# Altium footprint library Connectors.PcbLib: 72 footprints (part 3 of 5)
Each footprint in its own frame and in the unit in brackets; x right, y up, seen from the top. Pads: shape width x height; smd on the part's side, far side on the other; paste and mask are expansions set on the pad; w line width, h text height; cw(c..) or ccw(c..) is an arc to the next point about the centre after c.
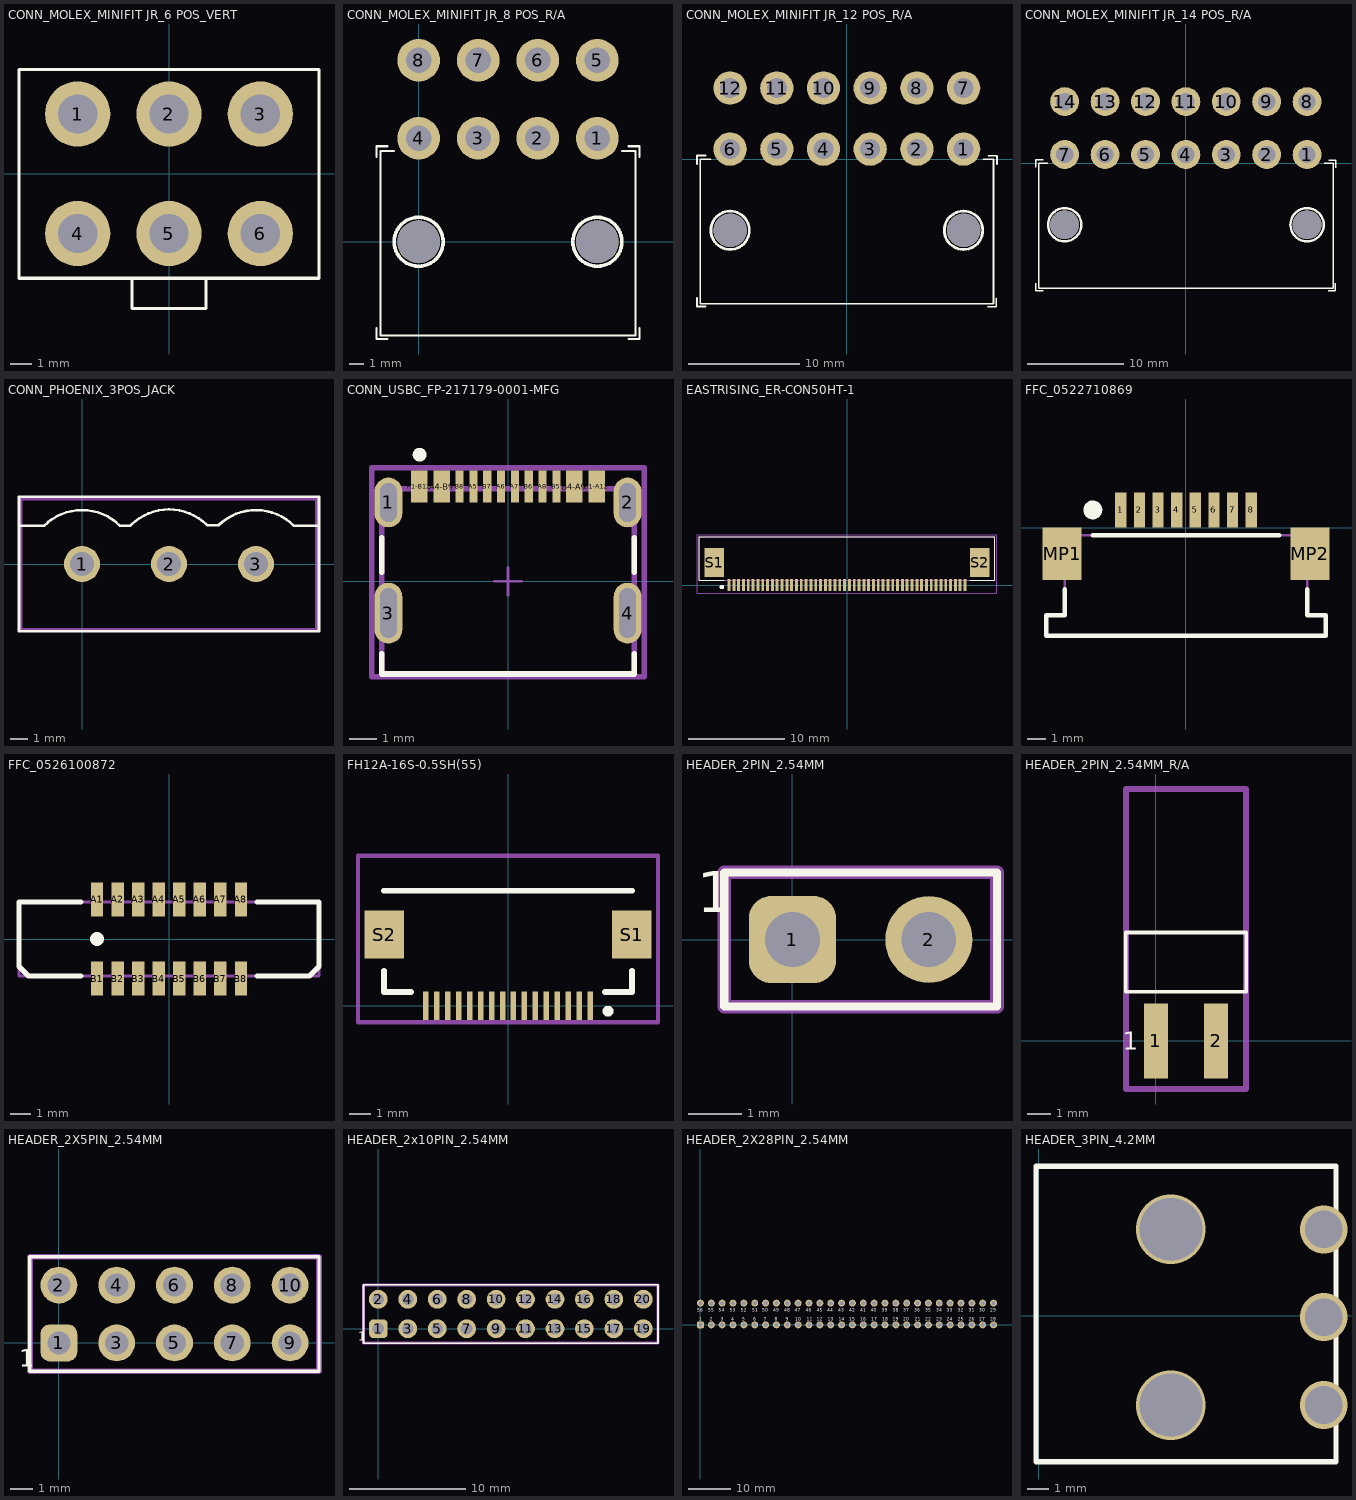
[diagram p2: the footprints below, top view; thin cyan lines are the x and y axes]

## CONN_MOLEX_MINIFIT JR_6 POS_VERT [mm] "Molex Minifit Jr 5566 6 Pos VERT"
pads (6):
  round 3 hole 1.8: 1(-4.2,2.75) 2(0,2.75) 4(-4.2,-2.75) 5(0,-2.75)
  round 3 hole 1.801: 3(4.2,2.75) 6(4.2,-2.75)
Top Overlay:
  lines w0.127: -1.7,-6.2 1.7,-6.2 1.7,-4.8 -1.7,-4.8 -1.7,-6.2
  lines w0.152: -6.9,-4.8 6.9,-4.8 6.9,4.8 -6.9,4.8 -6.9,-4.8
3D body "39-28-8060.stp": height 12.81, standoff -3.49, extent -7.234,-6.174 7.366,4.826

## CONN_MOLEX_MINIFIT JR_8 POS_R/A [mm] "Molex Minifit Jr 5569 8 Pos R/A"
pads (10):
  round 3 hole 1.801: 1(12.6,7.3) 2(8.4,7.3) 5(12.6,12.8) 6(8.4,12.8)
  round 3 hole 1.8: 3(4.2,7.3) 4(0,7.3) 7(4.2,12.8) 8(0,12.8)
  round 3 hole 3 unplated mask+0: ""(0,0) ""(12.6,0)
Top Overlay:
  circle w0.254: c0,0 r1.727
  circle w0.254: c12.6,0 r1.727
  lines w0.152: -2.98,-6.096 -2.98,-6.858 -2.218,-6.858 ; -2.98,5.969 -2.98,6.731 -2.218,6.731 ; -1.76,6.4 -2.7,6.4 -2.7,-6.604 15.3,-6.604 15.3,6.4 14.36,6.4 ; 14.818,-6.858 15.58,-6.858 15.58,-6.096 ; 14.818,6.731 15.58,6.731 15.58,5.969
3D body "039301080.stp": height 11.01, standoff -3.99, extent -2.7,-6.6 15.7,13.335

## CONN_MOLEX_MINIFIT JR_12 POS_R/A [mm] "Molex Minifit Jr 5569 12 Pos R/A"
pads (14):
  round 3 hole 1.801: 1(10.5,0.9) 2(6.3,0.9) 3(2.1,0.9) 4(-2.1,0.9) 7(10.5,6.4) 8(6.3,6.4) 9(2.1,6.4) 10(-2.1,6.4)
  round 3 hole 1.8: 5(-6.3,0.9) 6(-10.5,0.9) 11(-6.3,6.4) 12(-10.5,6.4)
  round 3 hole 3 unplated mask+0: ""(-10.5,-6.4) ""(10.5,-6.4)
Top Overlay:
  circle w0.254: c10.5,-6.4 r1.727
  circle w0.254: c-10.5,-6.4 r1.727
  lines w0.152: -13.48,-12.496 -13.48,-13.258 -12.718,-13.258 ; -13.48,-0.431 -13.48,0.331 -12.718,0.331 ; -12.26,0 -13.2,0 -13.2,-13.004 13.2,-13.004 13.2,0 12.26,0 ; 12.684,-13.27 13.446,-13.27 13.446,-12.508 ; 12.744,0.301 13.506,0.301 13.506,-0.461
3D body "039300120.stp": height 11.01, standoff -3.99, extent -13.274,-13.083 13.526,6.852

## CONN_MOLEX_MINIFIT JR_14 POS_R/A [mm] "Molex Minifit Jr 5569 14 Pos R/A"
pads (16):
  round 3 hole 1.801: 1(12.6,0.9) 2(8.4,0.9) 3(4.2,0.9) 4(0,0.9) 8(12.6,6.4) 9(8.4,6.4) 10(4.2,6.4) 11(0,6.4)
  round 3 hole 1.8: 5(-4.2,0.9) 6(-8.4,0.9) 7(-12.6,0.9) 12(-4.2,6.4) 13(-8.4,6.4) 14(-12.6,6.4)
  round 3 hole 3 unplated mask+0: ""(-12.6,-6.4) ""(12.6,-6.4)
Top Overlay:
  circle w0.254: c-12.6,-6.4 r1.727
  circle w0.254: c12.6,-6.4 r1.727
  lines w0.152: -15.58,-12.496 -15.58,-13.258 -14.818,-13.258 ; -15.58,-0.431 -15.58,0.331 -14.818,0.331 ; -14.36,0 -15.3,0 -15.3,-13.004 15.3,-13.004 15.3,0 14.36,0 ; 14.784,-13.27 15.546,-13.27 15.546,-12.508 ; 14.844,0.301 15.606,0.301 15.606,-0.461
3D body "039301140.stp": height 11.4, standoff -3.6, extent -15.3,-12.9 15.7,7.035

## CONN_PHOENIX_3POS_JACK [mm] "3 position phoenix connector jack end"
pads (3):
  round 2.1 hole 1.4: 1(0,0) 2(5.08,0) 3(10.16,0)
Top Overlay:
  lines w0.152: -3.683,2.227 -2.227,2.227 cw(c0,0) 2.227,2.227 2.814,2.227 ; 2.853,2.266 cw(c5.08,0.038) 7.307,2.266 7.933,2.266 ; 7.972,2.266 cw(c10.16,0) 12.387,2.227 13.843,2.227 ; -3.683,-3.937 13.843,-3.937 13.843,3.937 -3.683,3.937 -3.683,-3.937
Mechanical 1:
  lines w0.152: -3.54,-3.81 13.7,-3.81 13.7,3.8 -3.54,3.8 -3.54,-3.81
3D body "pxc_1755749_04_MSTBVA-2-5-3-G-5-08_3D.stp": height 12.01, standoff -3.89, extent -3.537,-4.7 13.703,3.87

## CONN_USBC_FP-217179-0001-MFG [mm] "USB-C (USB TYPE-C) USB 2.0 Receptacle Connector 24 (16+8 Dummy) Position Surface Mount, Right Angle; Through Hole"
pads (16):
  rrect100% 1x1.8 hole 1.4 slot 0.6 at 0 deg paste-2539.97 mask+0: 1(-4.32,2.85) 2(4.32,2.85)
  rrect100% 1x2.2 hole 1.8 slot 0.6 at 0 deg paste-2539.97 mask+0: 3(-4.32,-1.15) 4(4.32,-1.15)
  rect 0.6x1.15 smd paste+0 mask+0: A1-B12(-3.2,3.425) A4-B9(-2.4,3.425) B1-A12(3.2,3.425) B4-A9(2.4,3.425)
  rect 0.3x1.15 smd paste+0 mask+0: A5(-1.25,3.425) A6(-0.25,3.425) A7(0.25,3.425) A8(1.25,3.425) B5(1.75,3.425) B6(0.75,3.425) B7(-0.75,3.425) B8(-1.75,3.425)
Top Overlay:
  circle w0.25: c-3.195,4.575 r0.125
  lines w0.2: -4.57,-2.625 -4.57,-3.35 4.57,-3.35 4.57,-2.625 ; -4.57,0.325 -4.57,1.575 ; 4.57,0.325 4.57,1.575
Top 3D Body:
  lines w0.2: -4.57,-3.35 4.57,-3.35 4.57,3.35 -4.57,3.35 -4.57,-3.35
Top Assembly:
  lines w0.2: -4.92,-3.45 4.92,-3.45 4.92,4.1 -4.92,4.1 -4.92,-3.45
  text ".Designator" at 0,0.513 h1
Top Courtyard:
  lines w0.2: -4.92,-3.45 4.92,-3.45 4.92,4.1 -4.92,4.1 -4.92,-3.45
Top Component Center:
  lines w0.1: -0.5,0 0.5,0 ; 0,-0.5 0,0.5
3D body "Conn_Molex_217179-0001_eec.STEP": height 0.25, standoff 0, extent -4.92,-3.45 4.92,4.1

## EASTRISING_ER-CON50HT-1 [mm]
pads (52):
  rect 0.3x1.25 smd: 1(-12.25,0) 2(-11.75,0) 3(-11.25,0) 4(-10.75,0) 5(-10.25,0) 6(-9.75,0) 7(-9.25,0) 8(-8.75,0) 9(-8.25,0) 10(-7.75,0) 11(-7.25,0) 12(-6.75,0) 13(-6.25,0) 14(-5.75,0) 15(-5.25,0) 16(-4.75,0) 17(-4.25,0) 18(-3.75,0) 19(-3.25,0) 20(-2.75,0) 21(-2.25,0) 22(-1.75,0) 23(-1.25,0) 24(-0.75,0) 25(-0.25,0) 26(0.25,0) 27(0.75,0) 28(1.25,0) 29(1.75,0) 30(2.25,0) 31(2.75,0) 32(3.25,0) 33(3.75,0) 34(4.25,0) 35(4.75,0) 36(5.25,0) 37(5.75,0) 38(6.25,0) 39(6.75,0) 40(7.25,0) 41(7.75,0) 42(8.25,0) 43(8.75,0) 44(9.25,0) 45(9.75,0) 46(10.25,0) 47(10.75,0) 48(11.25,0) 49(11.75,0) 50(12.25,0)
  rect 2x3 smd: S1(-13.79,2.325) S2(13.79,2.325)
Top Overlay:
  circle w0.25: c-13,-0.2 r0.1
  lines w0.127: -12.75,0.5 -15.325,0.5 -15.325,5 15.325,5 15.325,0.5 12.75,0.5
Mechanical 13:
  circle w0.25: c-13,-0.2 r0.1
  lines w0.127: -15.325,0.5 15.325,0.5 15.325,5 -15.325,5 -15.325,0.5
Mechanical 15:
  lines w0.05: -15.575,-0.875 15.575,-0.875 15.575,5.25 -15.575,5.25 -15.575,-0.875

## FFC_0522710869 [mm] "Molex FFC 8 Bottom 1.00MM R/A"
pads (10):
  rect 0.6x1.9 smd: 1(-3.5,0.95) 2(-2.5,0.95) 3(-1.5,0.95) 4(-0.5,0.95) 5(0.5,0.95) 6(1.5,0.95) 7(2.5,0.95) 8(3.5,0.95)
  rect 2.1x2.8 smd: MP1(-6.65,-1.4) MP2(6.65,-1.4)
Top Overlay:
  circle w0.508: c-5,0.95 r0.254
  lines w0.254: -7.5,-4.7 -7.5,-5.8 7.5,-5.8 7.5,-4.7 ; -7.494,-4.7 -6.5,-4.7 -6.5,-3.3 ; -5,-0.4 5,-0.4 ; 6.5,-3.3 6.5,-4.7 7.494,-4.7
Mechanical 1:
  lines w0.127: -7.5,-4.7 -7.5,-5.8 7.5,-5.8 7.5,-4.7 ; -7.494,-4.7 -6.5,-4.7 -6.5,-0.4 6.5,-0.4 6.5,-4.7 7.494,-4.7
3D body "522710869.stp": height 3.01, standoff 0.01, extent -7.5,-5.8 7.5,1.6

## FFC_0526100872 [mm] "Molex FFC VERT 8POS 1.00MM SMD"
pads (16):
  rect 0.6x1.65 smd: A1(-3.5,1.925) A2(-2.5,1.925) A3(-1.5,1.925) A4(-0.5,1.925) A5(0.5,1.925) A6(1.5,1.925) A7(2.5,1.925) A8(3.5,1.925) B1(-3.5,-1.925) B2(-2.5,-1.925) B3(-1.5,-1.925) B4(-0.5,-1.925) B5(0.5,-1.925) B6(1.5,-1.925) B7(2.5,-1.925) B8(3.5,-1.925)
Top Overlay:
  circle w0.339: c-3.5,0 r0.169
  lines w0.254: -4.3,-1.8 -6.836,-1.8 -7.3,-1.336 -7.3,1.8 -4.3,1.8 ; 4.3,-1.8 6.836,-1.8 7.3,-1.336 7.3,1.8 4.3,1.8
Mechanical 1:
  lines w0.127: -7.3,-1.8 -7.3,1.8 7.3,1.8 7.3,-1.8 -7.3,-1.8
3D body "526100872.stp": height 5.76, standoff 0.01, extent -7.3,-2.25 7.3,2.25

## FH12A-16S-0.5SH(55) [mm]
pads (18):
  rect 0.25x1.3 smd mask+0.025: 1(3.75,0) 2(3.25,0) 3(2.75,0) 4(2.25,0) 5(1.75,0) 6(1.25,0) 7(0.75,0) 8(0.25,0) 9(-0.25,0) 10(-0.75,0) 11(-1.25,0) 12(-1.75,0) 13(-2.25,0) 14(-2.75,0) 15(-3.25,0) 16(-3.75,0)
  rect 1.8x2.2 smd: S1(5.65,3.25) S2(-5.65,3.25)
Top Overlay:
  circle w0.25: c4.572,-0.254 r0.125
  lines w0.25: -5.675,5.25 5.675,5.25
  lines w0.267: -5.675,1.6 -5.675,0.625 -4.435,0.625 ; 4.435,0.625 5.675,0.625 5.675,1.6
Mechanical 1:
  lines w0.203: -6.858,-0.762 6.858,-0.762 6.858,6.858 -6.858,6.858 -6.858,-0.762
3D body "FH12A-16S-0.5SH.stp": height 2.05, standoff -0.1, extent -6.25,-0.254 6.25,6.746

## HEADER_2PIN_2.54MM [mm]
pads (2):
  rrect50% 1.62x1.62 hole 1.02: 1(0,0)
  round 1.62 hole 1.02: 2(2.54,0)
Top Overlay:
  lines w0.152: -1.27,-1.25 3.81,-1.25 3.81,1.25 -1.27,1.25 -1.27,-1.25
  text "1" at -1.778,0.508 h0.76
Mechanical 1:
  lines w0.254: -1.27,-1.25 3.81,-1.25 3.81,1.25 -1.27,1.25 -1.27,-1.25
3D body "PREC002SAAN-RC.STEP": height 8.39, standoff -3.04, extent -1.27,-1.25 3.81,1.29

## HEADER_2PIN_2.54MM_R/A [mm]
pads (2):
  rect 1.02x3.17 smd: 1(0,0) 2(2.54,0)
Top Overlay:
  lines w0.152: -1.27,2.072 -1.27,4.572 3.81,4.572 3.81,2.072 -1.27,2.072
  text "1" at -1.397,-0.381 h0.76
Mechanical 1:
  lines w0.254: -1.27,-2.032 -1.27,10.628 3.81,10.628 3.81,-2.032 -1.27,-2.032
3D body "m20-8890245_asm.stp": height 2.51, standoff 0.01, extent -1.27,-0.944 3.81,10.552

## HEADER_2X5PIN_2.54MM [mm]
pads (10):
  rrect50% 1.62x1.62 hole 1.02: 1(0,0)
  round 1.62 hole 1.02: 2(0,2.54) 3(2.54,0) 4(2.54,2.54) 5(5.08,0) 6(5.08,2.54) 7(7.62,0) 8(7.62,2.54)
  round 1.62 hole 1: 9(10.16,0) 10(10.16,2.54)
Top Overlay:
  lines w0.152: -1.27,-1.25 11.43,-1.25 11.43,3.79 -1.27,3.79 -1.27,-1.25
  text "1" at -1.753,-1.041 h0.76
Mechanical 1:
  lines w0.254: -1.27,-1.25 11.43,-1.25 11.43,3.79 -1.27,3.79 -1.27,-1.25
3D body "Pin Header 2x5 TH Pitch 2.54mm.stp": height 9.5, standoff -3.2, extent -1.27,-1.27 11.43,3.81

## HEADER_2x10PIN_2.54MM [mm]
pads (20):
  rrect50% 1.62x1.62 hole 1.02: 1(0,0)
  round 1.62 hole 1.02: 2(0,2.54) 3(2.54,0) 4(2.54,2.54) 5(5.08,0) 6(5.08,2.54) 7(7.62,0) 8(7.62,2.54)
  round 1.62 hole 1: 9(10.16,0) 10(10.16,2.54) 11(12.7,0) 12(12.7,2.54) 13(15.24,0) 14(15.24,2.54) 15(17.78,0) 16(17.78,2.54) 17(20.32,0) 18(20.32,2.54) 19(22.86,0) 20(22.86,2.54)
Top Overlay:
  lines w0.152: -1.27,-1.25 24.13,-1.25 24.13,3.79 -1.27,3.79 -1.27,-1.25
  text "1" at -1.753,-1.041 h0.76
Mechanical 1:
  lines w0.254: -1.27,-1.25 24.13,-1.25 24.13,3.79 -1.27,3.79 -1.27,-1.25
3D body "XG8T-2031.STEP": height 7.01, standoff -2.99, extent -1.27,-1.25 24.13,3.75

## HEADER_2X28PIN_2.54MM [mm]
pads (56):
  rrect50% 1.62x1.62 hole 1.02: 1(0,0)
  round 1.62 hole 1.02: 2(2.54,0) 3(5.08,0) 4(7.62,0) 5(10.16,0) 6(12.7,0) 7(15.24,0) 8(17.78,0) 9(20.32,0) 10(22.86,0) 11(25.4,0) 12(27.94,0) 13(30.48,0) 14(33.02,0) 15(35.56,0) 16(38.1,0) 17(40.64,0) 18(43.18,0) 19(45.72,0) 20(48.26,0) 21(50.8,0) 22(53.34,0) 23(55.88,0) 24(58.42,0) 25(60.96,0) 26(63.5,0) 27(66.04,0) 28(68.58,0) 29(68.58,5.08) 30(66.04,5.08) 31(63.5,5.08) 32(60.96,5.08) 33(58.42,5.08) 34(55.88,5.08) 35(53.34,5.08) 36(50.8,5.08) 37(48.26,5.08) 38(45.72,5.08) 39(43.18,5.08) 40(40.64,5.08) 41(38.1,5.08) 42(35.56,5.08) 43(33.02,5.08) 44(30.48,5.08) 45(27.94,5.08) 46(25.4,5.08) 47(22.86,5.08) 48(20.32,5.08) 49(17.78,5.08) 50(15.24,5.08) 51(12.7,5.08) 52(10.16,5.08) 53(7.62,5.08) 54(5.08,5.08) 55(2.54,5.08) 56(0,5.08)
Top Overlay:
  text "35" at 52.578,3.048 h0.76
  text "38" at 44.958,3.048 h0.76
  text "37" at 47.498,3.048 h0.76
  text "36" at 50.038,3.048 h0.76
  text "34" at 55.118,3.048 h0.76
  text "33" at 57.658,3.048 h0.76
  text "32" at 60.198,3.048 h0.76
  text "31" at 62.738,3.048 h0.76
  text "30" at 65.278,3.048 h0.76
  text "29" at 67.818,3.048 h0.76
  text "56" at -0.762,3.048 h0.76
  text "55" at 1.778,3.048 h0.76
  text "54" at 4.318,3.048 h0.76
  text "53" at 6.858,3.048 h0.76
  text "52" at 9.398,3.048 h0.76
  text "51" at 12.065,3.048 h0.76
  text "48" at 19.558,3.048 h0.76
  text "50" at 14.478,3.048 h0.76
  text "49" at 17.018,3.048 h0.76
  text "47" at 22.098,3.048 h0.76
  text "46" at 24.638,3.048 h0.76
  text "45" at 27.178,3.048 h0.76
  text "44" at 29.718,3.048 h0.76
  text "43" at 32.258,3.048 h0.76
  text "42" at 34.798,3.048 h0.76
  text "41" at 37.402,3.048 h0.76
  text "40" at 39.878,3.048 h0.76
  text "39" at 42.418,3.048 h0.76
  text "28" at 67.818,1.016 h0.76
  text "27" at 65.278,1.016 h0.76
  text "26" at 62.738,1.016 h0.76
  text "25" at 60.198,1.016 h0.76
  text "24" at 57.658,1.016 h0.76
  text "23" at 55.118,1.016 h0.76
  text "22" at 52.578,1.016 h0.76
  text "21" at 50.165,1.016 h0.76
  text "20" at 47.498,1.016 h0.76
  text "19" at 45.022,1.016 h0.76
  text "18" at 42.482,1.016 h0.76
  text "17" at 39.942,1.016 h0.76
  text "16" at 37.402,1.016 h0.76
  text "15" at 34.862,1.016 h0.76
  text "14" at 32.322,1.016 h0.76
  text "13" at 29.782,1.016 h0.76
  text "12" at 27.242,1.016 h0.76
  text "11" at 24.829,1.016 h0.76
  text "10" at 22.162,1.016 h0.76
  text "9" at 19.939,1.016 h0.76
  text "8" at 17.399,1.016 h0.76
  text "7" at 14.859,1.016 h0.76
  text "6" at 12.319,1.016 h0.76
  text "5" at 9.779,1.016 h0.76
  text "4" at 7.239,1.016 h0.76
  text "3" at 4.699,1.016 h0.76
  text "2" at 2.159,1.016 h0.76
  text "1" at -0.254,1.016 h0.76

## HEADER_3PIN_4.2MM [mm] "CONN HEADER R/A 3POS 4.2MM"
pads (3):
  oval 0.3x1 all layers, no hole: 1(13.589,4.115) 2(13.589,-0.076) 3(13.589,-4.267)
via 6.299,-4.267 diameter 3.302 hole 2.997
via 13.589,4.115 diameter 2.286 hole 1.803
via 13.589,-0.076 diameter 2.286 hole 1.803
via 13.589,-4.267 diameter 2.286 hole 1.803
via 6.299,4.115 diameter 3.302 hole 2.997
Top Overlay:
  lines w0.254: -0.127,-6.96 14.173,-6.96 14.173,7.112 -0.127,7.112 -0.127,-6.96
3D body "039303037.stp": height 7.2, standoff -3.5, extent -0.025,-6.849 14.06,6.951